# Altium schematic symbol library FPGA_Xilinx_Virtex6.SchLib: 28 symbols (part 5 of 21) (continued)
## XC6VHX380T-FF1924 (continued)
part T pins: AB22 VREFN_0 (io), AB23 VP_0 (io), AC22 VN_0 (io), AC23 VREFP_0 (io), AD22 DXN_0 (io), AD23 DXP_0 (io), AH12 TDO_0 (io), AH32 CSI_B_0 (io), AJ13 TCK_0 (io), AJ33 CCLK_0 (io), AK11 TDI_0 (io), AK12 TMS_0 (io), AK32 DOUT_BUSY_0 (io), T12 VCCO_0 (power), T13 DONE_0 (io), T14 INIT_B_0 (io), T32 M1_0 (io), T33 M2_0 (io), U13 HSWAPEN_0 (io), U33 PROGRAM_B_0 (io), V12 VCCO_0 (power), V32 M0_0 (io), W13 DIN_0 (io), W33 RDWR_B_0 (io)
part U pins: A7 GND (power), A16 GND (power), A26 GND (power), A36 GND (power), A38 GND (power), AA12 VCCAUX (power), AA13 VBATT_0 (power), AA14 VCCINT (power), AA16 VCCINT (power), AA18 VCCINT (power), AA20 VCCINT (power), AA22 AVSS_0 (power), AA23 AVDD_0 (power), AA24 VCCINT (power), AA26 VCCINT (power), AA28 VCCINT (power), AA30 VCCINT (power), AA32 VCCAUX (power), AB13 VCCAUX (power), AB15 VCCINT (power), AB17 VCCINT (power), AB19 VCCINT (power), AB21 VCCINT (power), AB25 VCCINT (power), AB27 VCCINT (power), AB29 VCCINT (power), AB31 VCCINT (power), AB33 VCCAUX (power), AC12 VCCAUX (power), AC14 VCCINT (power), AC16 VCCINT (power), AC18 VCCINT (power), AC20 VCCINT (power), AC24 VCCINT (power), AC26 VCCINT (power), AC28 VCCINT (power), AC30 VCCINT (power), AC32 VCCAUX (power), AD13 VCCAUX (power), AD15 VCCINT (power), AD17 VCCINT (power), AD19 VCCINT (power), AD21 VCCINT (power), AD25 VCCINT (power), AD27 VCCINT (power), AD29 VCCINT (power), AD31 VCCINT (power), AD33 VCCAUX (power), AE12 VCCAUX (power), AE14 VCCINT (power), AE16 VCCINT (power), AE18 VCCINT (power), AE20 VCCINT (power), AE22 VCCINT (power), AE24 VCCINT (power), AE26 VCCINT (power), AE28 VCCINT (power), AE30 VCCINT (power), AE32 VCCAUX (power), AF13 VCCAUX (power), AF15 VCCINT (power), AF17 VCCINT (power), AF19 VCCINT (power), AF21 VCCINT (power), AF23 VCCINT (power), AF25 VCCINT (power), AF27 VCCINT (power), AF29 VCCINT (power), AF31 VCCINT (power), AF33 VCCAUX (power), AG12 VCCAUX (power), AG14 VCCINT (power), AG16 VCCINT (power), AG18 VCCINT (power), AG20 VCCINT (power), AG22 VCCINT (power), AG24 VCCINT (power), AG26 VCCINT (power), AG28 VCCINT (power), AG30 VCCINT (power), AG32 VCCAUX (power), AH13 VCCAUX (power), AH15 VCCINT (power), AH17 VCCINT (power), AH19 VCCINT (power), AH21 VCCINT (power), AH23 VCCINT (power), AH25 VCCINT (power), AH27 VCCINT (power), AH29 VCCINT (power), AH31 VCCINT (power), AH33 VCCAUX (power), AJ22 VCCINT (power), AJ24 VCCINT (power), AK33 VFS_0 (power), B7 GND (power), B13 GND (power), B23 GND (power), B33 GND (power), B38 GND (power), C7 GND (power), C8 GND (power), C9 GND (power), C10 GND (power), C20 GND (power), C30 GND (power), C36 GND (power), C37 GND (power), C38 GND (power), D9 GND (power), D17 GND (power), D27 GND (power), D36 GND (power), E9 GND (power), E14 GND (power), E24 GND (power), E34 GND (power), E36 GND (power), F9 GND (power), F11 GND (power), F21 GND (power), F31 GND (power), F36 GND (power), G9 GND (power), G18 GND (power), G28 GND (power), G36 GND (power), H9 GND (power), H15 GND (power), H25 GND (power), H35 GND (power), H36 GND (power), J9 GND (power), J12 GND (power), J22 GND (power), J32 GND (power), J36 GND (power), K9 GND (power), K19 GND (power), K29 GND (power), K36 GND (power), L9 GND (power), L16 GND (power), L26 GND (power), L36 GND (power), M9 GND (power), M13 GND (power), M23 GND (power), M33 GND (power), M36 GND (power), N9 GND (power), N10 GND (power), N20 GND (power), N30 GND (power), N36 GND (power), P9 GND (power), P17 GND (power), P27 GND (power), P36 GND (power), R9 GND (power), R10 GND (power), R11 GND (power), R14 GND (power), R24 GND (power), R34 GND (power), R35 GND (power), R36 GND (power), T8 GND (power), T11 GND (power), T18 GND (power), T19 VCCINT (power), T20 GND (power), T21 VCCINT (power), T22 GND (power), T23 VCCINT (power), T24 GND (power), T25 VCCINT (power), T28 GND (power), T31 GND (power), T34 GND (power), T37 GND (power), U10 GND (power), U11 GND (power), U12 VCCAUX (power), U14 VCCINT (power), U15 GND (power), U16 VCCINT (power), U17 GND (power), U18 VCCINT (power), U19 GND (power), U20 VCCINT (power), U21 GND (power), U22 VCCINT (power), U23 GND (power), U24 VCCINT (power), U25 GND (power), U26 VCCINT (power), U27 GND (power), U28 VCCINT (power), U29 GND (power), U30 VCCINT (power), U31 GND (power), U32 VCCAUX (power), U34 GND (power), U35 GND (power), V13 VCCAUX (power), V15 VCCINT (power), V17 VCCINT (power), V19 VCCINT (power), V21 VCCINT (power), V23 VCCINT (power), V25 VCCINT (power), V27 VCCINT (power), V29 VCCINT (power), V31 VCCINT (power), V33 VCCAUX (power), W12 VCCAUX (power), W14 VCCINT (power), W16 VCCINT (power), W18 VCCINT (power), W20 VCCINT (power), W22 VCCINT (power), W24 VCCINT (power), W26 VCCINT (power), W28 VCCINT (power), W30 VCCINT (power), W32 VCCAUX (power), Y13 VCCAUX (power), Y15 VCCINT (power), Y17 VCCINT (power), Y19 VCCINT (power), Y21 VCCINT (power), Y23 VCCINT (power), Y25 VCCINT (power), Y27 VCCINT (power), Y29 VCCINT (power), Y31 VCCINT (power), Y33 VCCAUX (power)
part V pins: AA1 GND (power), AA2 GND (power), AA5 GND (power), AA6 GND (power), AA10 GND (power), AA11 GND (power), AA15 GND (power), AA17 GND (power), AA19 GND (power), AA21 GND (power), AA25 GND (power), AA27 GND (power), AA29 GND (power), AA31 GND (power), AA33 GND (power), AA34 GND (power), AA35 GND (power), AA39 GND (power), AA40 GND (power), AA43 GND (power), AA44 GND (power), AB3 GND (power), AB7 GND (power), AB8 GND (power), AB11 GND (power), AB12 GND (power), AB14 GND (power), AB16 GND (power), AB18 GND (power), AB20 GND (power), AB24 GND (power), AB26 GND (power), AB28 GND (power), AB30 GND (power), AB32 GND (power), AB34 GND (power), AB37 GND (power), AB38 GND (power), AB42 GND (power), AC1 GND (power), AC5 GND (power), AC6 GND (power), AC10 GND (power), AC11 GND (power), AC13 GND (power), AC15 GND (power), AC17 GND (power), AC19 GND (power), AC21 GND (power), AC25 GND (power), AC27 GND (power), AC29 GND (power), AC31 GND (power), AC33 GND (power), AC34 GND (power), AC35 GND (power), AC39 GND (power), AC40 GND (power), AC44 GND (power), AD4 GND (power), AD7 GND (power), AD8 GND (power), AD11 GND (power), AD12 GND (power), AD14 GND (power), AD16 GND (power), AD18 GND (power), AD20 GND (power), AD24 GND (power), AD26 GND (power), AD28 GND (power), AD30 GND (power), AD32 GND (power), AD34 GND (power), AD37 GND (power), AD38 GND (power), AD41 GND (power), AE1 GND (power), AE2 GND (power), AE5 GND (power), AE6 GND (power), AE10 GND (power), AE11 GND (power), AE13 GND (power), AE15 GND (power), AE17 GND (power), AE19 GND (power), AE21 GND (power), AE23 GND (power), AE25 GND (power), AE27 GND (power), AE29 GND (power), AE31 GND (power), AE33 GND (power), AE34 GND (power), AE35 GND (power), AE39 GND (power), AE40 GND (power), AE43 GND (power), AE44 GND (power), AF3 GND (power), AF7 GND (power), AF8 GND (power), AF11 GND (power), AF12 GND (power), AF14 GND (power), AF16 GND (power), AF18 GND (power), AF20 GND (power), AF22 GND (power), AF24 GND (power), AF26 GND (power), AF28 GND (power), AF30 GND (power), AF32 GND (power), AF34 GND (power), AF37 GND (power), AF38 GND (power), AF42 GND (power), AG1 GND (power), AG5 GND (power), AG6 GND (power), AG10 GND (power), AG11 GND (power), AG13 GND (power), AG15 GND (power), AG17 GND (power), AG19 GND (power), AG21 GND (power), AG23 GND (power), AG25 GND (power), AG27 GND (power), AG29 GND (power), AG31 GND (power), AG33 GND (power), AG34 GND (power), AG35 GND (power), AG39 GND (power), AG40 GND (power), AG44 GND (power), AH4 GND (power), AH7 GND (power), AH8 GND (power), AH11 GND (power), AH14 GND (power), AH16 GND (power), AH18 GND (power), AH20 GND (power), AH22 GND (power), AH24 GND (power), AH26 GND (power), AH28 GND (power), AH30 GND (power), AH34 GND (power), AH37 GND (power), AH38 GND (power), AH41 GND (power), AJ1 GND (power), AJ2 GND (power), AJ5 GND (power), AJ6 GND (power), AJ9 GND (power), AJ10 GND (power), AJ11 GND (power), AJ12 GND (power), AJ21 GND (power), AJ23 GND (power), AJ32 GND (power), AJ34 GND (power), AJ35 GND (power), AJ36 GND (power), AJ39 GND (power), AJ40 GND (power), AJ43 GND (power), AJ44 GND (power), AK3 GND (power), AK4 GND (power), AK7 GND (power), AK9 GND (power), AK19 GND (power), AK29 GND (power), AK36 GND (power), AK38 GND (power), AK41 GND (power), AK42 GND (power), AL1 GND (power), AL2 GND (power), AL5 GND (power), AL6 GND (power), AL9 GND (power), AL16 GND (power), AL26 GND (power), AL36 GND (power), AL39 GND (power), AL40 GND (power), AL43 GND (power), AL44 GND (power), AM3 GND (power), AM4 GND (power), AM7 GND (power), AM9 GND (power), AM13 GND (power), AM23 GND (power), AM33 GND (power), AM36 GND (power), AM38 GND (power), AM41 GND (power), AM42 GND (power), AN1 GND (power), AN5 GND (power), AN6 GND (power), AN9 GND (power), AN10 GND (power), AN20 GND (power), AN30 GND (power), AN36 GND (power), AN39 GND (power), AN40 GND (power), AN44 GND (power), AP4 GND (power), AP7 GND (power), AP9 GND (power), AP17 GND (power), AP27 GND (power), AP36 GND (power), AP38 GND (power), AP41 GND (power), AR1 GND (power), AR2 GND (power), AR5 GND (power), AR6 GND (power), AR9 GND (power), AR14 GND (power), AR24 GND (power), AR34 GND (power), AR36 GND (power), AR39 GND (power), AR40 GND (power), AR43 GND (power), AR44 GND (power), AT3 GND (power), AT7 GND (power), AT9 GND (power), AT11 GND (power), AT21 GND (power), AT31 GND (power), AT36 GND (power), AT38 GND (power), AT42 GND (power), V3 GND (power), V7 GND (power), V11 GND (power), V14 GND (power), V16 GND (power), V18 GND (power), V20 GND (power), V22 GND (power), V24 GND (power), V26 GND (power), V28 GND (power), V30 GND (power), V34 GND (power), V38 GND (power), V42 GND (power), W1 GND (power), W5 GND (power), W6 GND (power), W10 GND (power), W11 GND (power), W15 GND (power), W17 GND (power), W19 GND (power), W21 GND (power), W23 GND (power), W25 GND (power), W27 GND (power), W29 GND (power), W31 GND (power), W34 GND (power), W35 GND (power), W39 GND (power), W40 GND (power), W44 GND (power), Y4 GND (power), Y7 GND (power), Y8 GND (power), Y11 GND (power), Y12 GND (power), Y14 GND (power), Y16 GND (power), Y18 GND (power), Y20 GND (power), Y22 GND (power), Y24 GND (power), Y26 GND (power), Y28 GND (power), Y30 GND (power), Y32 GND (power), Y34 GND (power), Y37 GND (power), Y38 GND (power), Y41 GND (power)
part W pins: AU1 GND (power), AU5 GND (power), AU6 GND (power), AU9 GND (power), AU18 GND (power), AU28 GND (power), AU36 GND (power), AU39 GND (power), AU40 GND (power), AU44 GND (power), AV4 GND (power), AV7 GND (power), AV9 GND (power), AV15 GND (power), AV25 GND (power), AV35 GND (power), AV36 GND (power), AV38 GND (power), AV41 GND (power), AW1 GND (power), AW2 GND (power), AW5 GND (power), AW6 GND (power), AW9 GND (power), AW12 GND (power), AW22 GND (power), AW32 GND (power), AW36 GND (power), AW39 GND (power), AW40 GND (power), AW43 GND (power), AW44 GND (power), AY3 GND (power), AY7 GND (power), AY9 GND (power), AY19 GND (power), AY29 GND (power), AY36 GND (power), AY38 GND (power), AY42 GND (power), BA1 GND (power), BA5 GND (power), BA6 GND (power), BA9 GND (power), BA16 GND (power), BA26 GND (power), BA36 GND (power), BA39 GND (power), BA40 GND (power), BA44 GND (power), BB4 GND (power), BB7 GND (power), BB9 GND (power), BB13 GND (power), BB23 GND (power), BB33 GND (power), BB36 GND (power), BB38 GND (power), BB41 GND (power), BC2 GND (power), BC5 GND (power), BC6 GND (power), BC9 GND (power), BC10 GND (power), BC20 GND (power), BC30 GND (power), BC36 GND (power), BC39 GND (power), BC40 GND (power), BC43 GND (power), BD3 GND (power), BD4 GND (power), BD7 GND (power), BD8 GND (power), BD9 GND (power), BD17 GND (power), BD27 GND (power), BD36 GND (power), BD37 GND (power), BD38 GND (power), BD41 GND (power), BD42 GND (power)

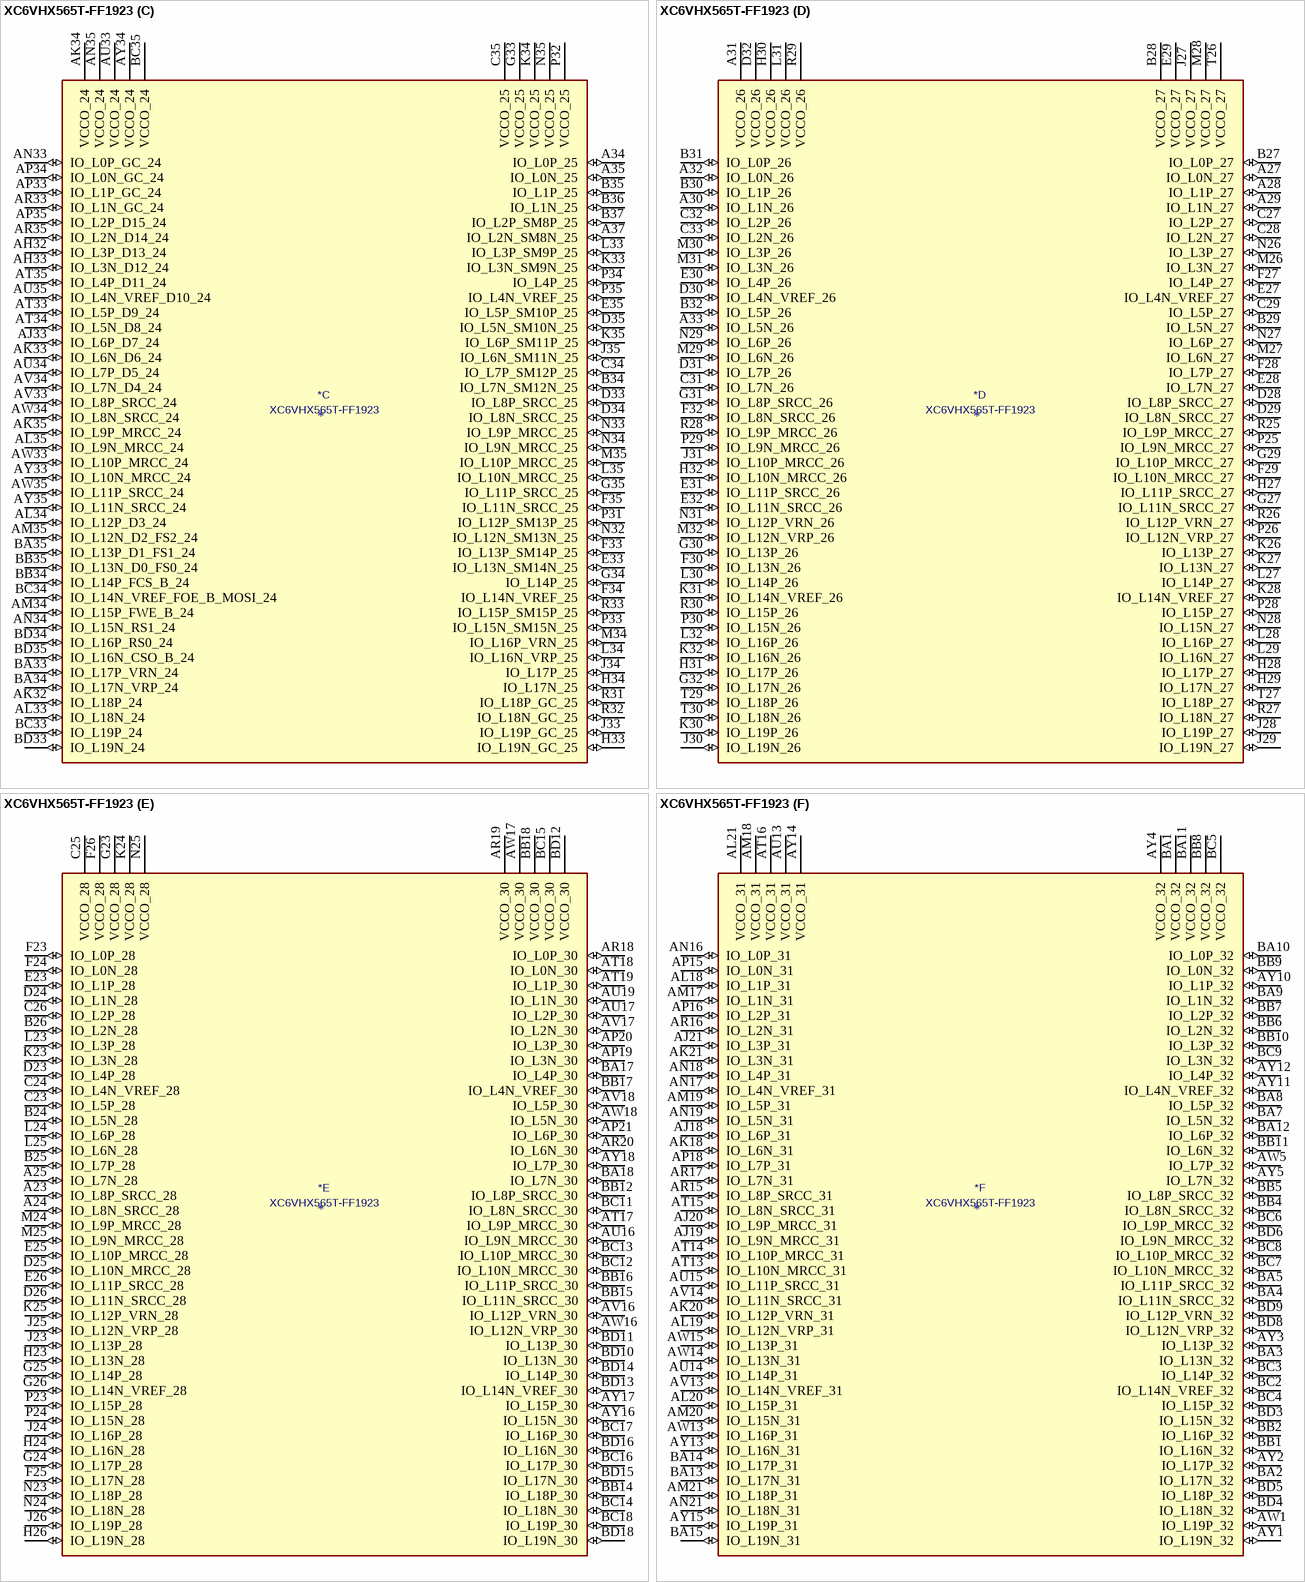
[diagram p25: symbol XC6VHX565T-FF1923]

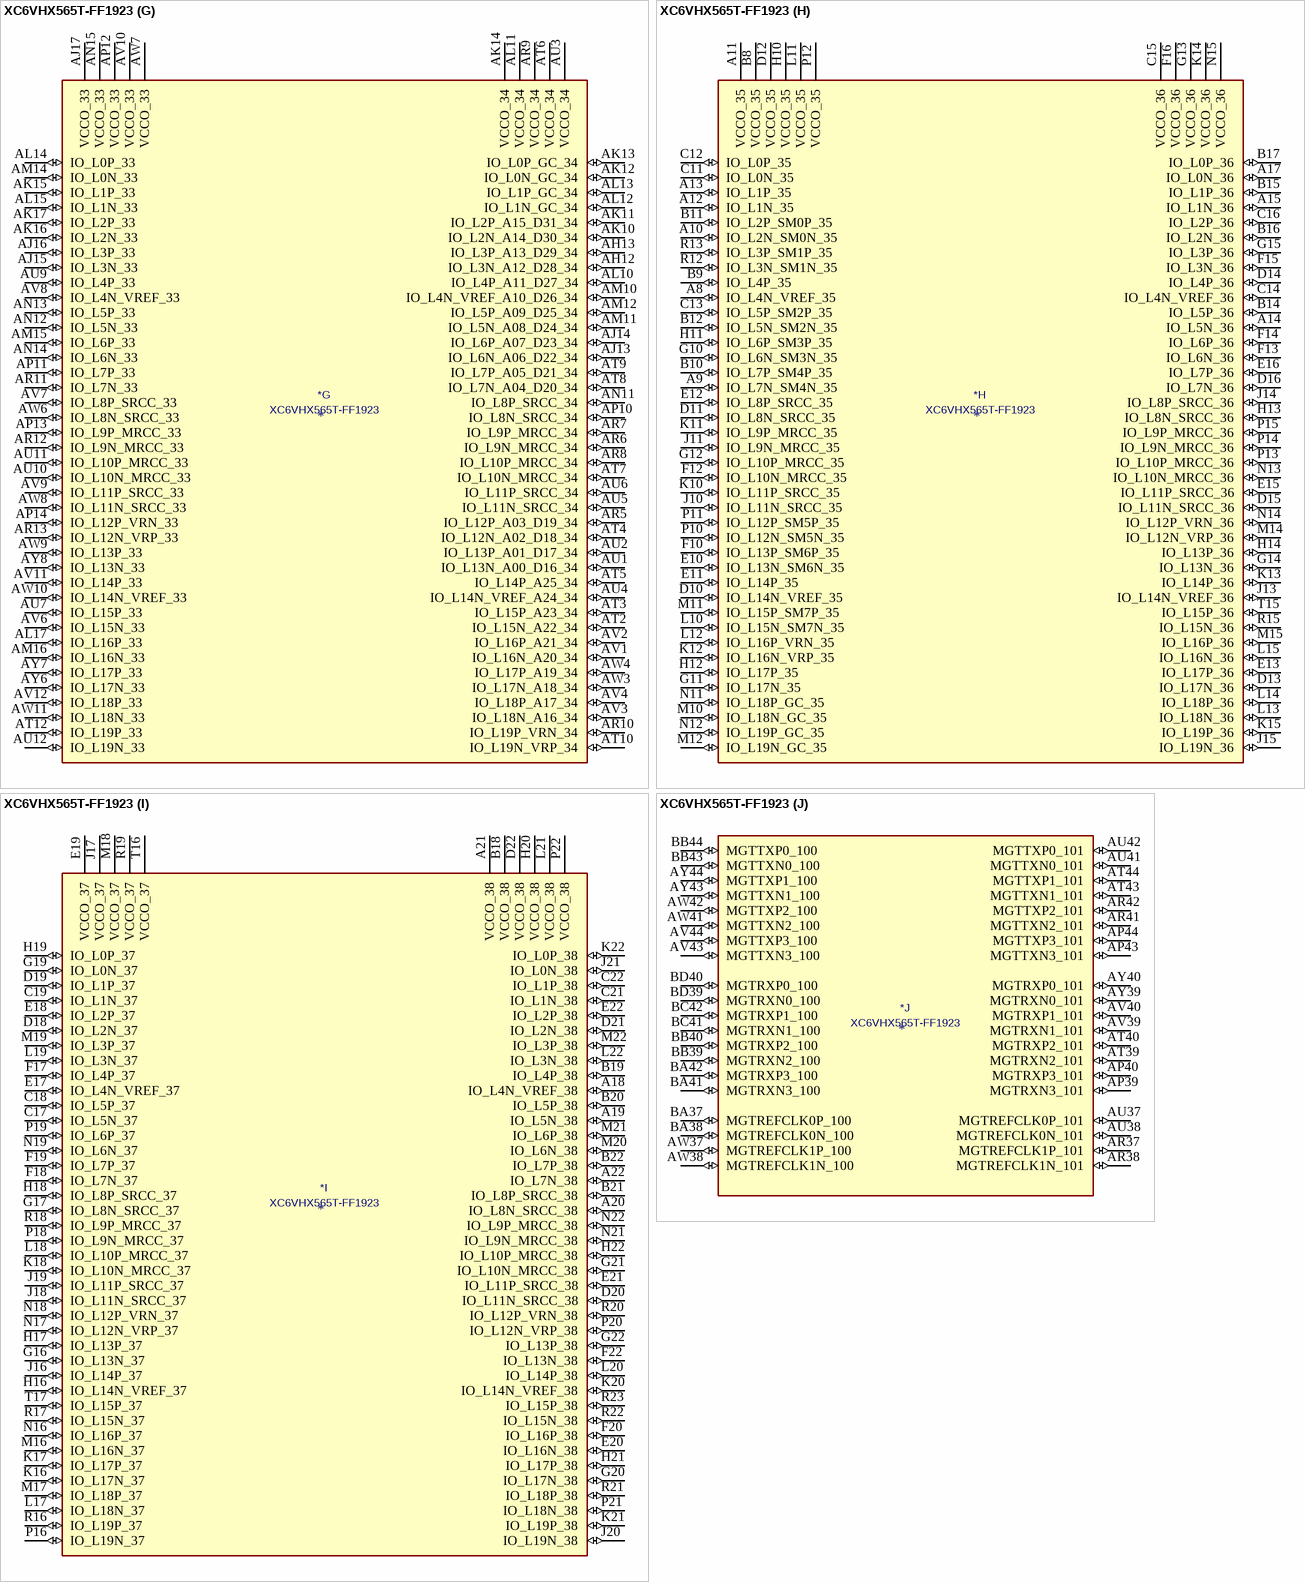
[diagram p26: symbol XC6VHX565T-FF1923]

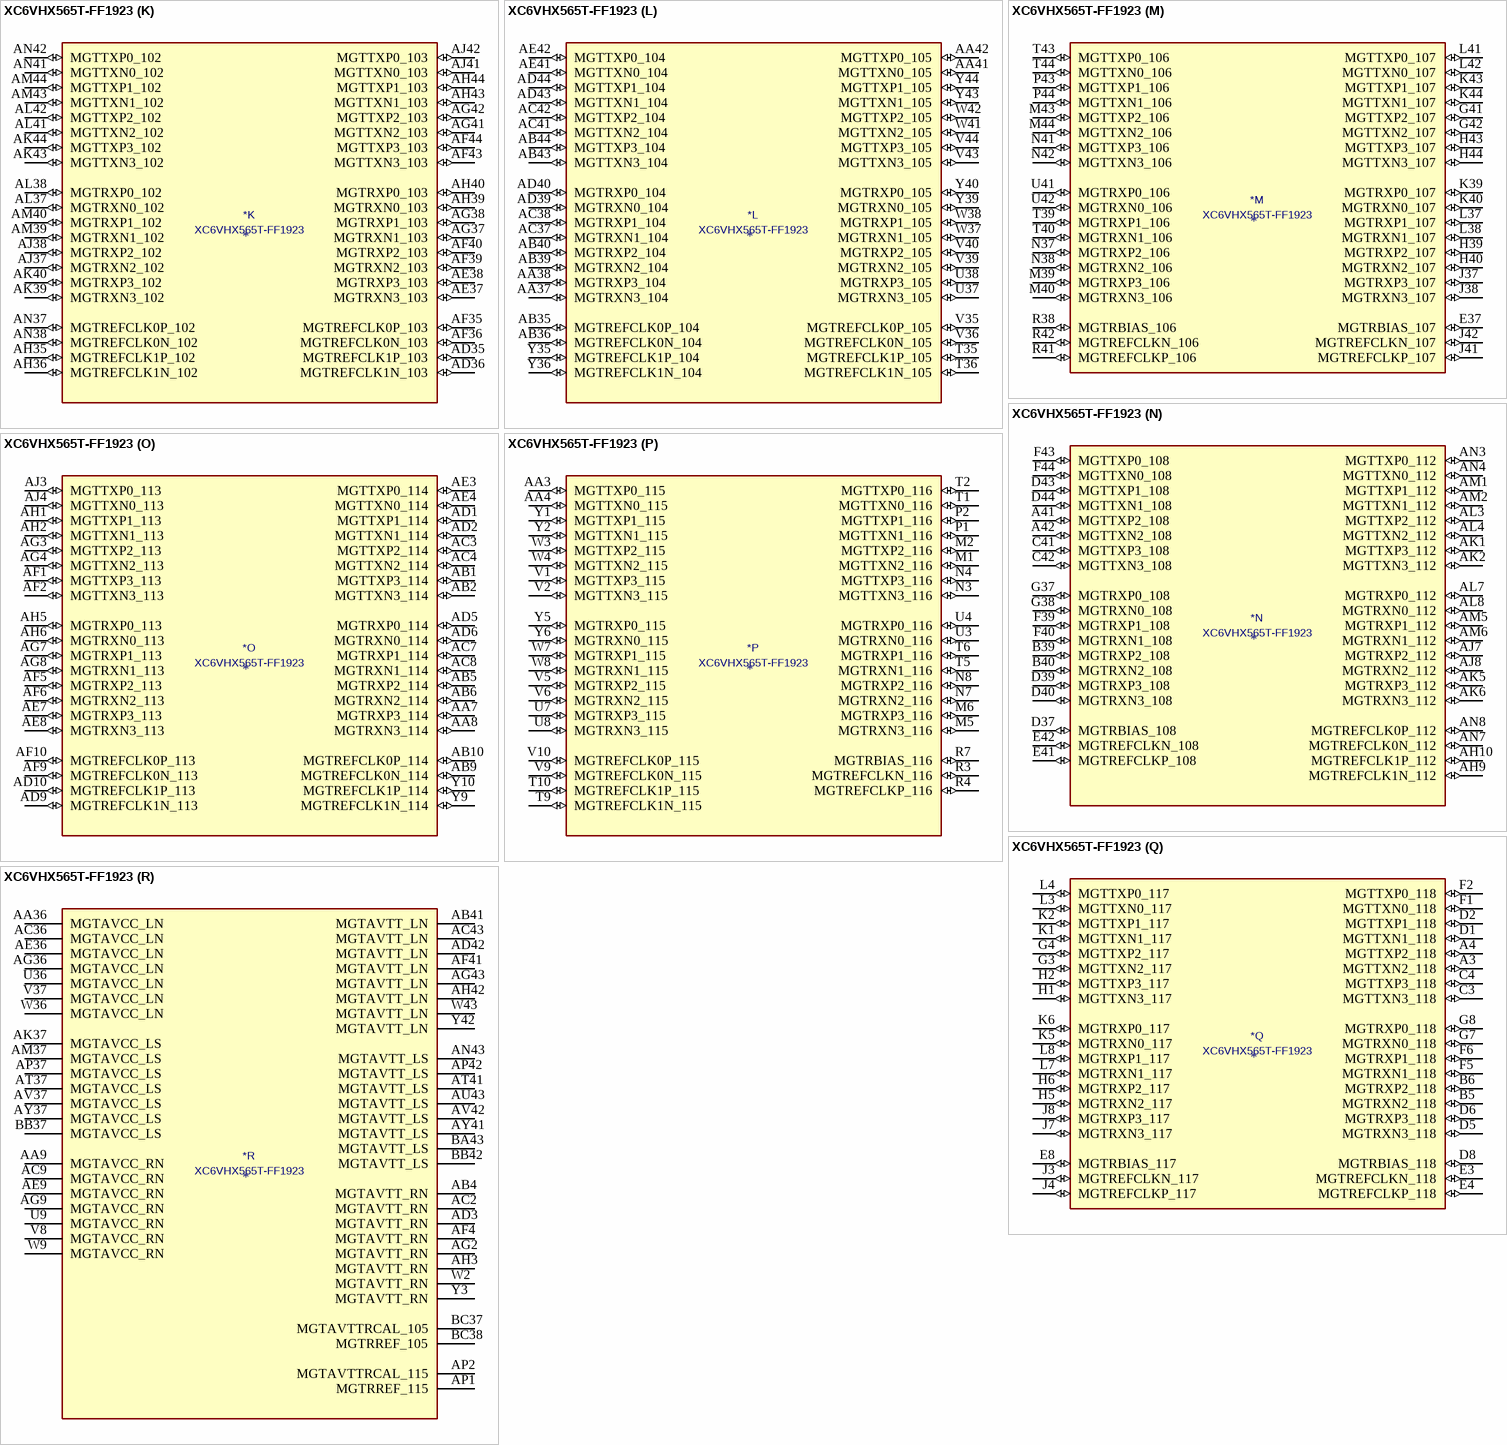
[diagram p27: symbol XC6VHX565T-FF1923]

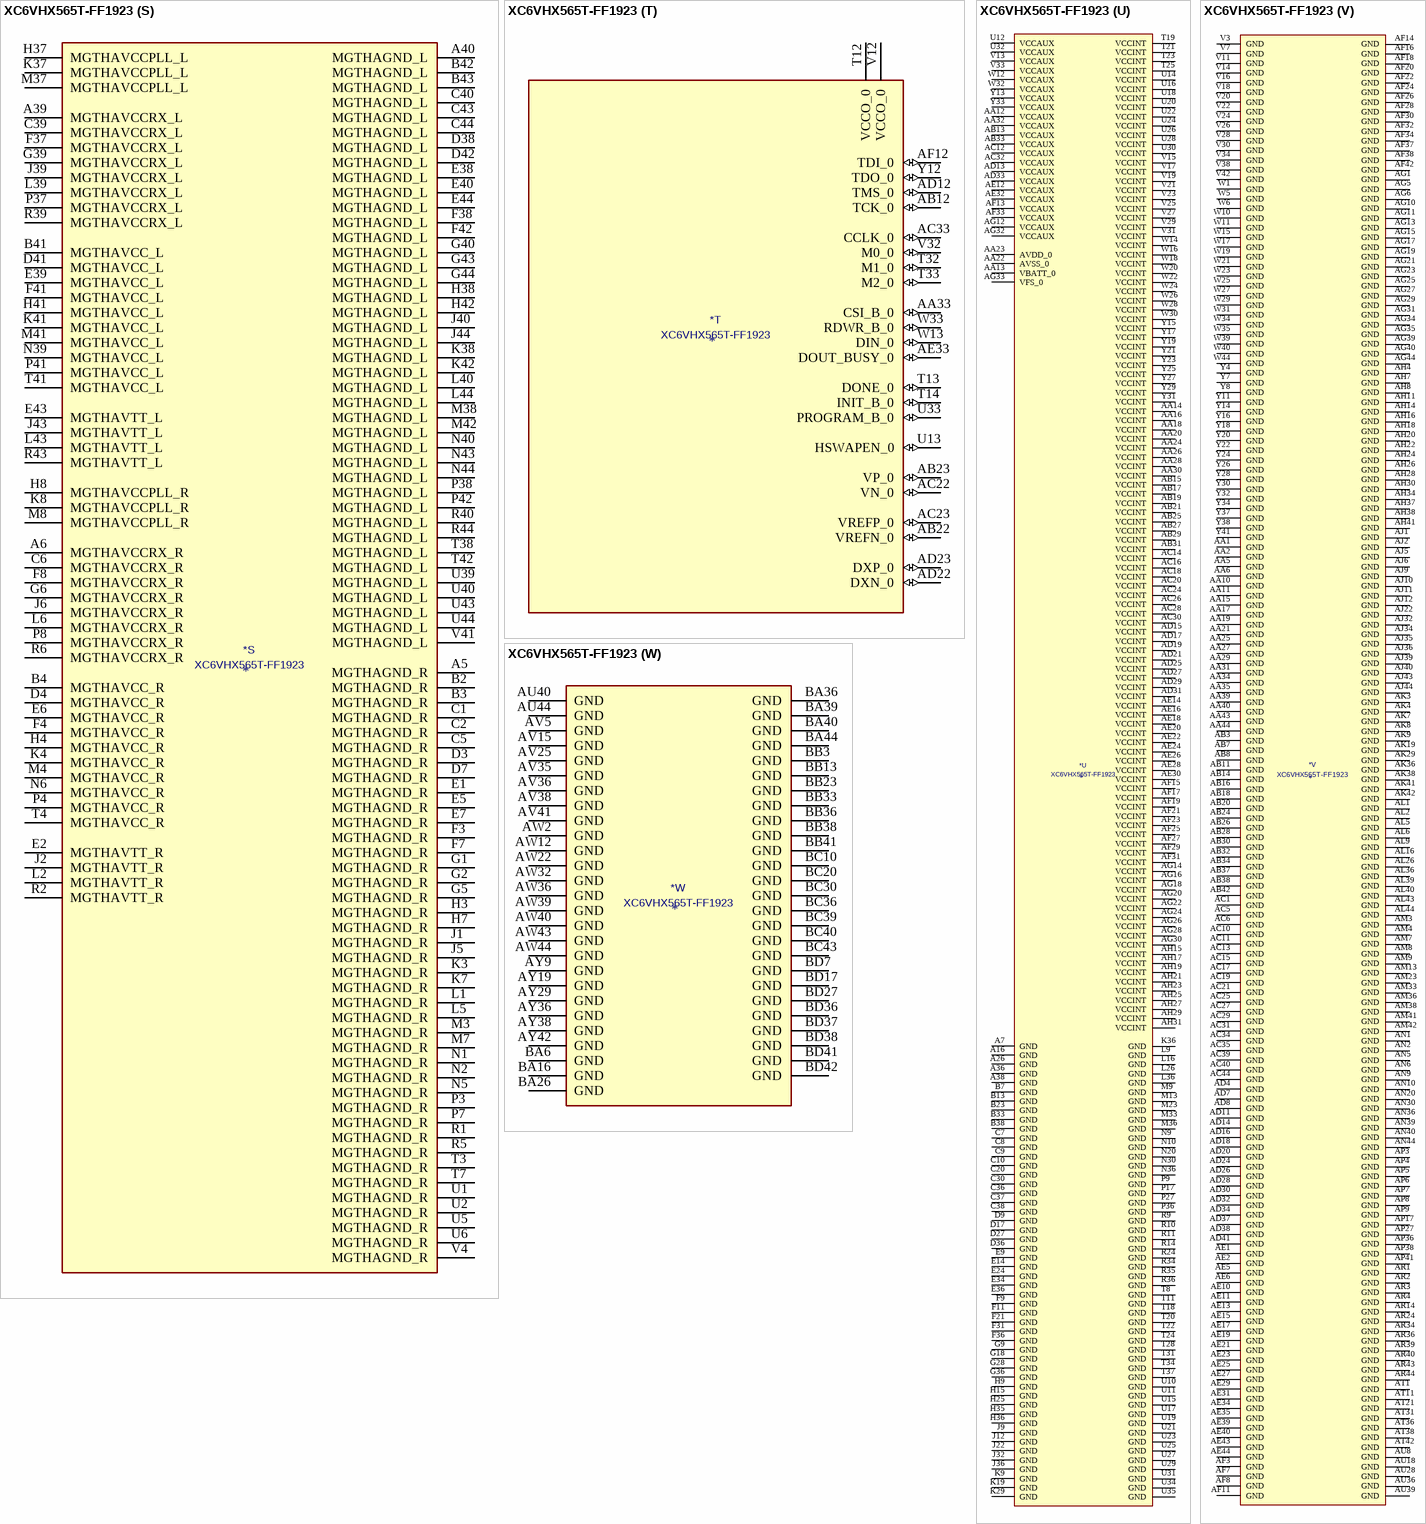
[diagram p28: symbol XC6VHX565T-FF1923]